# Altium footprint library 16PIN光耦座.PcbLib: 1 footprints
Each footprint in its own frame and in the unit in brackets; x right, y up, seen from the top. Pads: shape width x height; smd on the part's side, far side on the other; paste and mask are expansions set on the pad; w line width, h text height; cw(c..) or ccw(c..) is an arc to the next point about the centre after c.
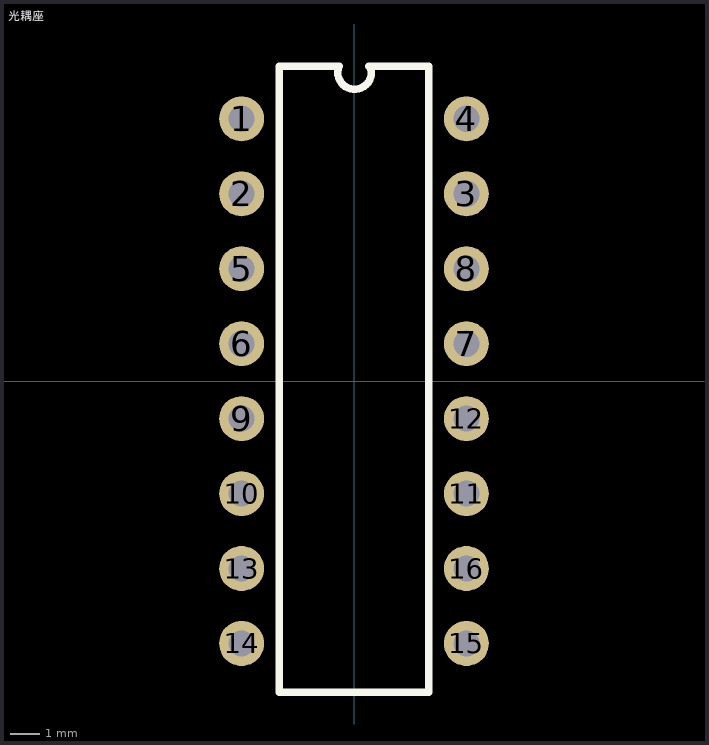
[diagram p0: the footprint, top view; thin cyan lines are the x and y axes]

## 光耦座 [mil] "16PIN"
pads (16):
  round 60 hole 35: 1(-150,350) 2(-150,250) 3(150,250) 4(150,350) 5(-150,150) 6(-150,50) 7(150,50) 8(150,150) 9(-150,-50) 10(-150,-150) 11(150,-150) 12(150,-50) 13(-150,-250) 14(-150,-350) 15(150,-350) 16(150,-250)
Top Overlay:
  lines w10: 20,420 100,420 100,-415 -100,-415 -100,420 -20,420 ccw(c0.76,411.7) 21.52,420